# Altium footprint library TarabusLibrary.PcbLib: 591 footprints (part 18 of 37)
Each footprint in its own frame and in the unit in brackets; x right, y up, seen from the top. Pads: shape width x height; smd on the part's side, far side on the other; paste and mask are expansions set on the pad; w line width, h text height; cw(c..) or ccw(c..) is an arc to the next point about the centre after c.
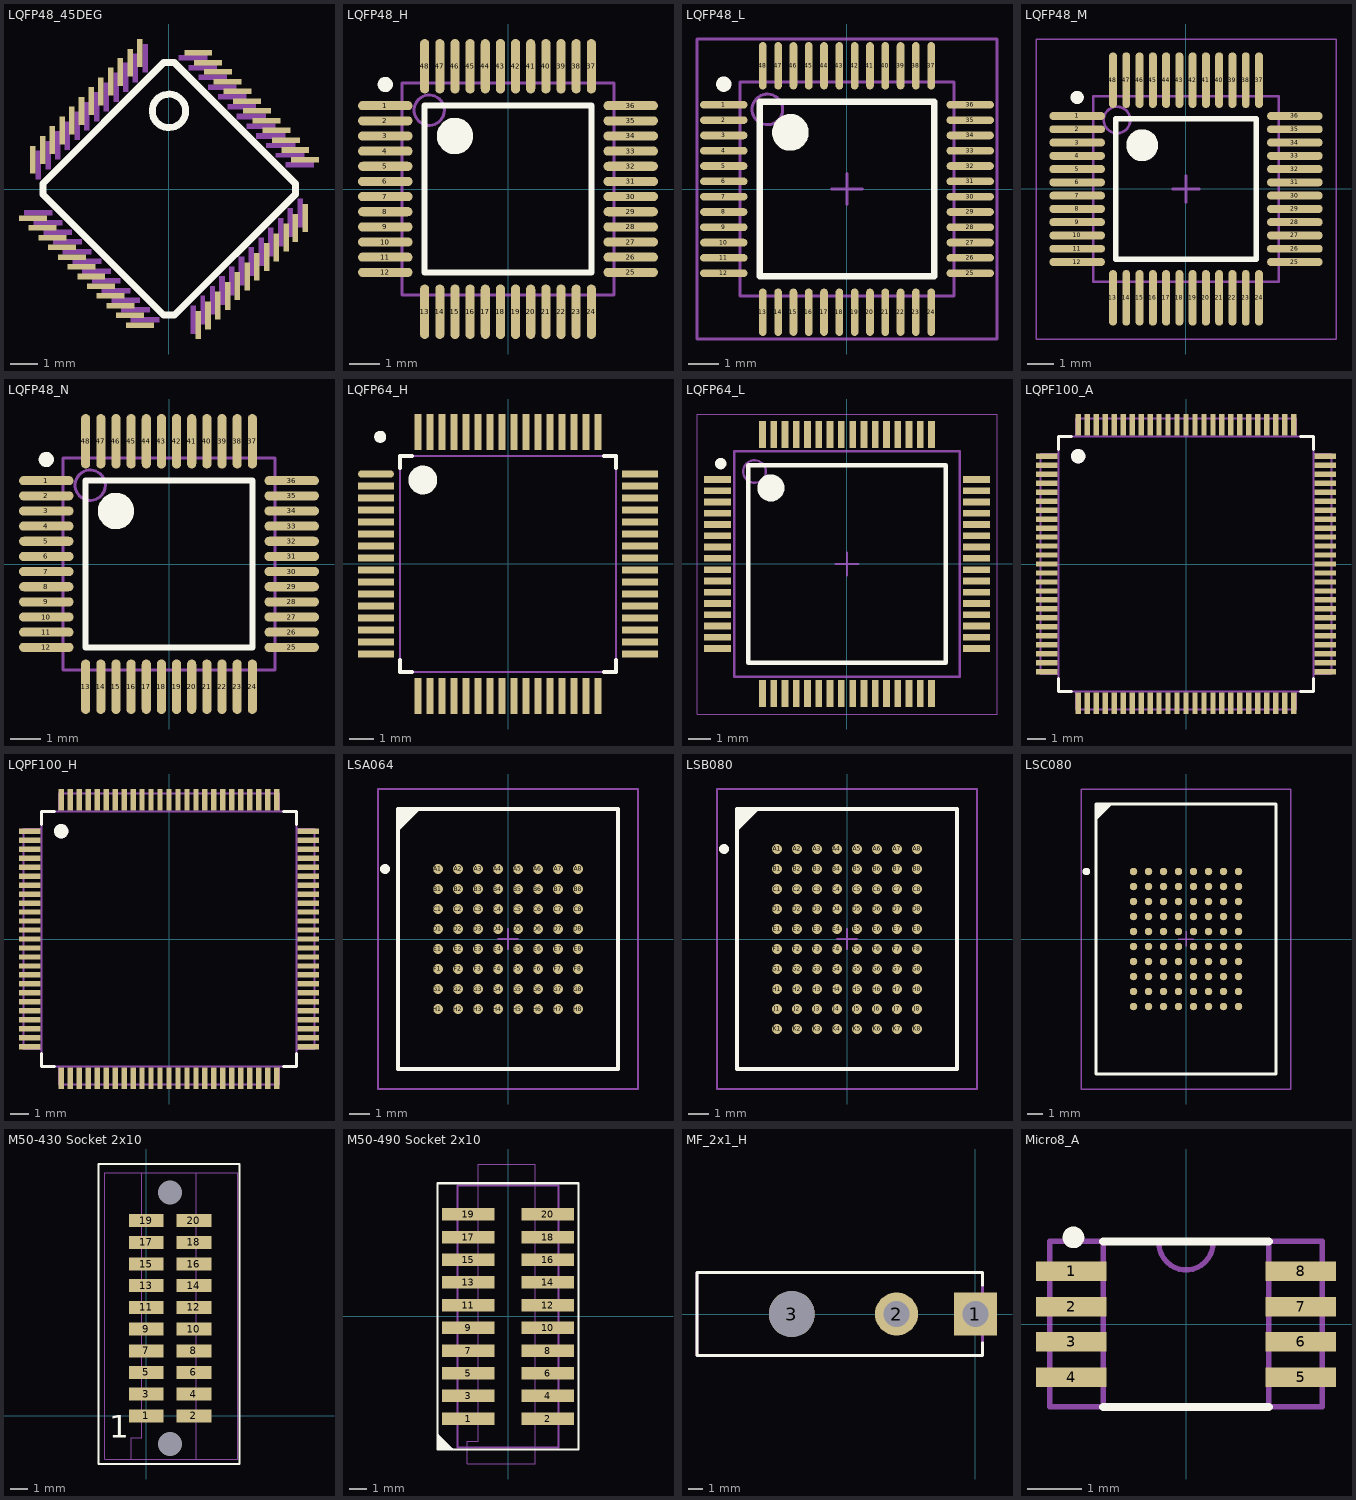
[diagram p17: the footprints below, top view; thin cyan lines are the x and y axes]

## LQFP48_45DEG [mil]
pads (48):
  rect 8x40 smd: 1(-41.76,195) 2(-55.68,181) 3(-69.59,168) 4(-83.52,154) 5(-97.43,140) 6(-111.35,126) 7(-125.27,112) 8(-139.19,98) 9(-153.11,84) 10(-167.03,70) 11(-180.95,56) 12(-194.87,42) 25(42,-194.87) 26(56,-180.95) 27(70,-167.03) 28(84,-153.11) 29(98,-139.19) 30(112,-125.27) 31(126,-111.35) 32(140,-97.43) 33(154,-83.52) 34(168,-69.59) 35(181,-55.68) 36(195,-41.76)
  rect 40x8 smd: 13(-194.87,-41.76) 14(-180.95,-55.68) 15(-167.03,-69.59) 16(-153.11,-83.52) 17(-139.19,-97.43) 18(-125.27,-111.35) 19(-111.35,-125.27) 20(-97.43,-139.19) 21(-83.52,-153.11) 22(-69.59,-167.03) 23(-55.68,-180.95) 24(-41.76,-194.87) 37(195,42) 38(181,56) 39(168,70) 40(154,84) 41(140,98) 42(126,112) 43(112,126) 44(98,140) 45(84,154) 46(70,168) 47(56,181) 48(42,195)
Top Overlay:
  circle w10: c0,112 r24
  lines w10: -180.26,-7.65 -180.26,8 -7.65,181 8,181 181,8 181,-7.65 8,-180.26 -7.65,-180.26 -180.26,-7.65
Mechanical 16:
  rectangle: 14,184 55,192
  rectangle: 28,170 69,178
  rectangle: 42,156 83,164
  rectangle: 56,142 97,150
  rectangle: 70,128 111,136
  rectangle: 84,114 125,122
  rectangle: 97,100 139,108
  rectangle: 111,86 153,94
  rectangle: 125,72 167,80
  rectangle: 139,59 181,66
  rectangle: 153,45 194,52
  rectangle: 167,31 208,39
  rectangle: 184,-54.77 192,-13.43
  rectangle: 170,-68.69 178,-27.35
  rectangle: 156,-82.61 164,-41.27
  rectangle: 142,-96.53 150,-55.19
  rectangle: 128,-110.45 136,-69.11
  rectangle: 114,-124.37 122,-83.03
  rectangle: 100,-138.29 108,-96.95
  rectangle: 86,-152.2 94,-110.87
  rectangle: 72,-166.13 80,-124.79
  rectangle: 59,-180.04 66,-138.7
  rectangle: 45,-193.96 52,-152.63
  rectangle: 31,-207.88 39,-166.54
  rectangle: -54.77,-191.15 -13.43,-183.28
  rectangle: -68.69,-177.23 -27.35,-169.36
  rectangle: -82.61,-163.31 -41.27,-155.44
  rectangle: -96.53,-149.39 -55.19,-141.52
  rectangle: -110.45,-135.47 -69.11,-127.6
  rectangle: -124.37,-121.56 -83.03,-113.68
  rectangle: -138.29,-107.63 -96.95,-99.76
  rectangle: -152.2,-93.72 -110.87,-85.84
  rectangle: -166.13,-79.8 -124.79,-71.92
  rectangle: -180.04,-65.88 -138.7,-58
  rectangle: -193.96,-51.96 -152.63,-44.08
  rectangle: -207.88,-38.04 -166.54,-30.17
  rectangle: -191.15,14 -183.28,55
  rectangle: -177.23,28 -169.36,69
  rectangle: -163.31,42 -155.44,83
  rectangle: -149.39,56 -141.52,97
  rectangle: -135.47,70 -127.6,111
  rectangle: -121.56,84 -113.68,125
  rectangle: -107.63,97 -99.76,139
  rectangle: -93.72,111 -85.84,153
  rectangle: -79.8,125 -71.92,167
  rectangle: -65.88,139 -58,181
  rectangle: -51.96,153 -44.08,194
  rectangle: -38.04,167 -30.17,208

## LQFP48_H [mm]
height 1.6
pads (48):
  oval 1.8x0.3 smd: 1(-4.05,2.75) 2(-4.05,2.25) 3(-4.05,1.75) 4(-4.05,1.25) 5(-4.05,0.75) 6(-4.05,0.25) 7(-4.05,-0.25) 8(-4.05,-0.75) 9(-4.05,-1.25) 10(-4.05,-1.75) 11(-4.05,-2.25) 12(-4.05,-2.75) 25(4.05,-2.75) 26(4.05,-2.25) 27(4.05,-1.75) 28(4.05,-1.25) 29(4.05,-0.75) 30(4.05,-0.25) 31(4.05,0.25) 32(4.05,0.75) 33(4.05,1.25) 34(4.05,1.75) 35(4.05,2.25) 36(4.05,2.75)
  oval 0.3x1.8 smd: 13(-2.75,-4.05) 14(-2.25,-4.05) 15(-1.75,-4.05) 16(-1.25,-4.05) 17(-0.75,-4.05) 18(-0.25,-4.05) 19(0.25,-4.05) 20(0.75,-4.05) 21(1.25,-4.05) 22(1.75,-4.05) 23(2.25,-4.05) 24(2.75,-4.05) 37(2.75,4.05) 38(2.25,4.05) 39(1.75,4.05) 40(1.25,4.05) 41(0.75,4.05) 42(0.25,4.05) 43(-0.25,4.05) 44(-0.75,4.05) 45(-1.25,4.05) 46(-1.75,4.05) 47(-2.25,4.05) 48(-2.75,4.05)
Top Overlay:
  circle w0.6: c-1.75,1.75 r0.3
  circle w0.25: c-4.05,3.45 r0.125
  lines w0.2: -2.75,-2.75 2.75,-2.75 2.75,2.75 -2.75,2.75 -2.75,-2.75
Mechanical 7:
  circle w0.1: c-2.6,2.6 r0.5
  lines w0.1: -3.5,-3.5 3.5,-3.5 3.5,3.5 -3.5,3.5 -3.5,-3.5
Mechanical 10:
  text ".Designator" at 1.9,5.4 h0.8
  text ".Comment" at -3.7,-5.6 h0.6
3D body "vbh48a.stp": height 1.46, standoff -0.04, extent -4.507,-4.507 4.508,4.508

## LQFP48_L [mm] "Thin QFP, 48-Leads, Body 7x7mm, Pitch 0.5mm, IPC High Density"
height 1.6
pads (48):
  oval 1.55x0.25 smd: 1(-4.025,2.75) 2(-4.025,2.25) 3(-4.025,1.75) 4(-4.025,1.25) 5(-4.025,0.75) 6(-4.025,0.25) 7(-4.025,-0.25) 8(-4.025,-0.75) 9(-4.025,-1.25) 10(-4.025,-1.75) 11(-4.025,-2.25) 12(-4.025,-2.75) 25(4.025,-2.75) 26(4.025,-2.25) 27(4.025,-1.75) 28(4.025,-1.25) 29(4.025,-0.75) 30(4.025,-0.25) 31(4.025,0.25) 32(4.025,0.75) 33(4.025,1.25) 34(4.025,1.75) 35(4.025,2.25) 36(4.025,2.75)
  oval 0.25x1.55 smd: 13(-2.75,-4.025) 14(-2.25,-4.025) 15(-1.75,-4.025) 16(-1.25,-4.025) 17(-0.75,-4.025) 18(-0.25,-4.025) 19(0.25,-4.025) 20(0.75,-4.025) 21(1.25,-4.025) 22(1.75,-4.025) 23(2.25,-4.025) 24(2.75,-4.025) 37(2.75,4.025) 38(2.25,4.025) 39(1.75,4.025) 40(1.25,4.025) 41(0.75,4.025) 42(0.25,4.025) 43(-0.25,4.025) 44(-0.75,4.025) 45(-1.25,4.025) 46(-1.75,4.025) 47(-2.25,4.025) 48(-2.75,4.025)
Top Overlay:
  circle w0.25: c-4.025,3.425 r0.125
  circle w0.6: c-1.85,1.85 r0.3
  lines w0.2: -2.85,-2.85 -2.85,2.85 2.85,2.85 2.85,-2.85 -2.85,-2.85
Mechanical 13:
  circle w0.1: c-2.6,2.6 r0.5
  lines w0.1: -3.5,-3.5 -3.5,3.5 3.5,3.5 3.5,-3.5 -3.5,-3.5
Mechanical 15:
  lines w0.1: -0.5,0 0.5,0 ; 0,-0.5 0,0.5 ; -4.9,-4.9 -4.9,4.9 4.9,4.9 4.9,-4.9 -4.9,-4.9
3D body: height 1.6, standoff 0, extent -3.5,-3.5 3.5,3.5

## LQFP48_M [mm] "QFP, 48-Leads, Body 7x7mm, Pitch 0.5mm, IPC Low Density"
height 1.6
pads (48):
  oval 2.1x0.3 smd: 1(-4.1,2.75) 2(-4.1,2.25) 3(-4.1,1.75) 4(-4.1,1.25) 5(-4.1,0.75) 6(-4.1,0.25) 7(-4.1,-0.25) 8(-4.1,-0.75) 9(-4.1,-1.25) 10(-4.1,-1.75) 11(-4.1,-2.25) 12(-4.1,-2.75) 25(4.1,-2.75) 26(4.1,-2.25) 27(4.1,-1.75) 28(4.1,-1.25) 29(4.1,-0.75) 30(4.1,-0.25) 31(4.1,0.25) 32(4.1,0.75) 33(4.1,1.25) 34(4.1,1.75) 35(4.1,2.25) 36(4.1,2.75)
  oval 0.3x2.1 smd: 13(-2.75,-4.1) 14(-2.25,-4.1) 15(-1.75,-4.1) 16(-1.25,-4.1) 17(-0.75,-4.1) 18(-0.25,-4.1) 19(0.25,-4.1) 20(0.75,-4.1) 21(1.25,-4.1) 22(1.75,-4.1) 23(2.25,-4.1) 24(2.75,-4.1) 37(2.75,4.1) 38(2.25,4.1) 39(1.75,4.1) 40(1.25,4.1) 41(0.75,4.1) 42(0.25,4.1) 43(-0.25,4.1) 44(-0.75,4.1) 45(-1.25,4.1) 46(-1.75,4.1) 47(-2.25,4.1) 48(-2.75,4.1)
Top Overlay:
  circle w0.6: c-1.65,1.65 r0.3
  circle w0.25: c-4.1,3.45 r0.125
  lines w0.2: -2.65,-2.65 2.65,-2.65 2.65,2.65 -2.65,2.65 -2.65,-2.65
Mechanical 13:
  circle w0.1: c-2.6,2.6 r0.5
  lines w0.1: -3.5,-3.5 3.5,-3.5 3.5,3.5 -3.5,3.5 -3.5,-3.5
Mechanical 15:
  lines w0.05: -5.65,-5.65 5.65,-5.65 5.65,5.65 -5.65,5.65 -5.65,-5.65
  lines w0.1: -0.5,0 0.5,0 ; 0,-0.5 0,0.5
3D body: height 1.6, standoff 0.05, extent -3.5,-3.5 3.5,3.5

## LQFP48_N [mm] "Thin QFP, 48-Leads, Body 7x7mm, Pitch 0.5mm, IPC Medium Density"
height 1.6
pads (48):
  oval 1.8x0.3 smd: 1(-4.05,2.75) 2(-4.05,2.25) 3(-4.05,1.75) 4(-4.05,1.25) 5(-4.05,0.75) 6(-4.05,0.25) 7(-4.05,-0.25) 8(-4.05,-0.75) 9(-4.05,-1.25) 10(-4.05,-1.75) 11(-4.05,-2.25) 12(-4.05,-2.75) 25(4.05,-2.75) 26(4.05,-2.25) 27(4.05,-1.75) 28(4.05,-1.25) 29(4.05,-0.75) 30(4.05,-0.25) 31(4.05,0.25) 32(4.05,0.75) 33(4.05,1.25) 34(4.05,1.75) 35(4.05,2.25) 36(4.05,2.75)
  oval 0.3x1.8 smd: 13(-2.75,-4.05) 14(-2.25,-4.05) 15(-1.75,-4.05) 16(-1.25,-4.05) 17(-0.75,-4.05) 18(-0.25,-4.05) 19(0.25,-4.05) 20(0.75,-4.05) 21(1.25,-4.05) 22(1.75,-4.05) 23(2.25,-4.05) 24(2.75,-4.05) 37(2.75,4.05) 38(2.25,4.05) 39(1.75,4.05) 40(1.25,4.05) 41(0.75,4.05) 42(0.25,4.05) 43(-0.25,4.05) 44(-0.75,4.05) 45(-1.25,4.05) 46(-1.75,4.05) 47(-2.25,4.05) 48(-2.75,4.05)
Top Overlay:
  circle w0.25: c-4.05,3.45 r0.125
  circle w0.6: c-1.75,1.75 r0.3
  lines w0.2: -2.75,-2.75 -2.75,2.75 2.75,2.75 2.75,-2.75 -2.75,-2.75
Mechanical 7:
  circle w0.1: c-2.6,2.6 r0.5
  lines w0.1: -3.5,-3.5 -3.5,3.5 3.5,3.5 3.5,-3.5 -3.5,-3.5
Mechanical 10:
  text ".Comment" at -3.7,-5.6 h0.6
  text ".Designator" at 1.9,5.4 h0.8
3D body "vbh48a.stp": height 1.46, standoff -0.04, extent -4.507,-4.507 4.508,4.508

## LQFP64_H [mm] "64-Pin Low Profile Quad Pack 0.5 mm Pitch, IPC High Density"
height 1.6
pads (64):
  oval 1.5x0.3 smd mask+0.05: 1(-5.5,3.75)
  rect 1.5x0.3 smd mask+0.05: 2(-5.5,3.25) 3(-5.5,2.75) 4(-5.5,2.25) 5(-5.5,1.75) 6(-5.5,1.25) 7(-5.5,0.75) 8(-5.5,0.25) 9(-5.5,-0.25) 10(-5.5,-0.75) 11(-5.5,-1.25) 12(-5.5,-1.75) 13(-5.5,-2.25) 14(-5.5,-2.75) 15(-5.5,-3.25) 16(-5.5,-3.75) 33(5.5,-3.75) 34(5.5,-3.25) 35(5.5,-2.75) 36(5.5,-2.25) 37(5.5,-1.75) 38(5.5,-1.25) 39(5.5,-0.75) 40(5.5,-0.25) 41(5.5,0.25) 42(5.5,0.75) 43(5.5,1.25) 44(5.5,1.75) 45(5.5,2.25) 46(5.5,2.75) 47(5.5,3.25) 48(5.5,3.75)
  rect 0.3x1.5 smd mask+0.05: 17(-3.75,-5.5) 18(-3.25,-5.5) 19(-2.75,-5.5) 20(-2.25,-5.5) 21(-1.75,-5.5) 22(-1.25,-5.5) 23(-0.75,-5.5) 24(-0.25,-5.5) 25(0.25,-5.5) 26(0.75,-5.5) 27(1.25,-5.5) 28(1.75,-5.5) 29(2.25,-5.5) 30(2.75,-5.5) 31(3.25,-5.5) 32(3.75,-5.5) 49(3.75,5.5) 50(3.25,5.5) 51(2.75,5.5) 52(2.25,5.5) 53(1.75,5.5) 54(1.25,5.5) 55(0.75,5.5) 56(0.25,5.5) 57(-0.25,5.5) 58(-0.75,5.5) 59(-1.25,5.5) 60(-1.75,5.5) 61(-2.25,5.5) 62(-2.75,5.5) 63(-3.25,5.5) 64(-3.75,5.5)
Top Overlay:
  circle w0.6: c-3.55,3.5 r0.3
  circle w0.25: c-5.325,5.3 r0.125
  lines w0.15: -4.5,-4 -4.5,-4.5 -4,-4.5 ; -4.5,4 -4.5,4.5 -4,4.5 ; 4,-4.5 4.5,-4.5 4.5,-4 ; 4,4.5 4.5,4.5 4.5,4
Mechanical 7:
  lines w0.1: -4.5,-4.5 4.5,-4.5 4.5,4.5 -4.5,4.5 -4.5,-4.5
3D body "User Library-lqpf64.step": height 1.5, standoff 0.02, extent -6,-6 6,6

## LQFP64_L [mm] "TSQFP, 64-Leads, Body 10,00x10,00mm, Pitch 0,50mm, IPC Medium Density"
height 1.6
pads (64):
  rect 1.2x0.3 smd: 1(-5.75,3.75) 2(-5.75,3.25) 3(-5.75,2.75) 4(-5.75,2.25) 5(-5.75,1.75) 6(-5.75,1.25) 7(-5.75,0.75) 8(-5.75,0.25) 9(-5.75,-0.25) 10(-5.75,-0.75) 11(-5.75,-1.25) 12(-5.75,-1.75) 13(-5.75,-2.25) 14(-5.75,-2.75) 15(-5.75,-3.25) 16(-5.75,-3.75) 33(5.75,-3.75) 34(5.75,-3.25) 35(5.75,-2.75) 36(5.75,-2.25) 37(5.75,-1.75) 38(5.75,-1.25) 39(5.75,-0.75) 40(5.75,-0.25) 41(5.75,0.25) 42(5.75,0.75) 43(5.75,1.25) 44(5.75,1.75) 45(5.75,2.25) 46(5.75,2.75) 47(5.75,3.25) 48(5.75,3.75)
  rect 0.3x1.2 smd: 17(-3.75,-5.75) 18(-3.25,-5.75) 19(-2.75,-5.75) 20(-2.25,-5.75) 21(-1.75,-5.75) 22(-1.25,-5.75) 23(-0.75,-5.75) 24(-0.25,-5.75) 25(0.25,-5.75) 26(0.75,-5.75) 27(1.25,-5.75) 28(1.75,-5.75) 29(2.25,-5.75) 30(2.75,-5.75) 31(3.25,-5.75) 32(3.75,-5.75) 49(3.75,5.75) 50(3.25,5.75) 51(2.75,5.75) 52(2.25,5.75) 53(1.75,5.75) 54(1.25,5.75) 55(0.75,5.75) 56(0.25,5.75) 57(-0.25,5.75) 58(-0.75,5.75) 59(-1.25,5.75) 60(-1.75,5.75) 61(-2.25,5.75) 62(-2.75,5.75) 63(-3.25,5.75) 64(-3.75,5.75)
Top Overlay:
  circle w0.6: c-3.375,3.375 r0.3
  circle w0.25: c-5.6,4.45 r0.125
  lines w0.2: -4.375,-4.375 4.375,-4.375 4.375,4.375 -4.375,4.375 -4.375,-4.375
Mechanical 7:
  circle w0.1: c-4.1,4.1 r0.5
  lines w0.1: -5,-5 5,-5 5,5 -5,5 -5,-5
Mechanical 15:
  lines w0.05: -6.65,-6.65 6.65,-6.65 6.65,6.65 -6.65,6.65 -6.65,-6.65
  lines w0.1: -0.5,0 0.5,0 ; 0,-0.5 0,0.5
3D body "LQFP64-0_5.STEP": height 1.55, standoff -0.02, extent -5.886,-5.886 5.886,5.886

## LQPF100_A [mm]
height 1.6
pads (100):
  rect 1.2x0.3 smd: 1(-7.75,6) 2(-7.75,5.5) 3(-7.75,5) 4(-7.75,4.5) 5(-7.75,4) 6(-7.75,3.5) 7(-7.75,3) 8(-7.75,2.5) 9(-7.75,2) 10(-7.75,1.5) 11(-7.75,1) 12(-7.75,0.5) 13(-7.75,0) 14(-7.75,-0.5) 15(-7.75,-1) 16(-7.75,-1.5) 17(-7.75,-2) 18(-7.75,-2.5) 19(-7.75,-3) 20(-7.75,-3.5) 21(-7.75,-4) 22(-7.75,-4.5) 23(-7.75,-5) 24(-7.75,-5.5) 25(-7.75,-6) 51(7.75,-6) 52(7.75,-5.5) 53(7.75,-5) 54(7.75,-4.5) 55(7.75,-4) 56(7.75,-3.5) 57(7.75,-3) 58(7.75,-2.5) 59(7.75,-2) 60(7.75,-1.5) 61(7.75,-1) 62(7.75,-0.5) 63(7.75,0) 64(7.75,0.5) 65(7.75,1) 66(7.75,1.5) 67(7.75,2) 68(7.75,2.5) 69(7.75,3) 70(7.75,3.5) 71(7.75,4) 72(7.75,4.5) 73(7.75,5) 74(7.75,5.5) 75(7.75,6)
  rect 0.3x1.2 smd: 26(-6,-7.75) 27(-5.5,-7.75) 28(-5,-7.75) 29(-4.5,-7.75) 30(-4,-7.75) 31(-3.5,-7.75) 32(-3,-7.75) 33(-2.5,-7.75) 34(-2,-7.75) 35(-1.5,-7.75) 36(-1,-7.75) 37(-0.5,-7.75) 38(0,-7.75) 39(0.5,-7.75) 40(1,-7.75) 41(1.5,-7.75) 42(2,-7.75) 43(2.5,-7.75) 44(3,-7.75) 45(3.5,-7.75) 46(4,-7.75) 47(4.5,-7.75) 48(5,-7.75) 49(5.5,-7.75) 50(6,-7.75) 76(6,7.75) 77(5.5,7.75) 78(5,7.75) 79(4.5,7.75) 80(4,7.75) 81(3.5,7.75) 82(3,7.75) 83(2.5,7.75) 84(2,7.75) 85(1.5,7.75) 86(1,7.75) 87(0.5,7.75) 88(0,7.75) 89(-0.5,7.75) 90(-1,7.75) 91(-1.5,7.75) 92(-2,7.75) 93(-2.5,7.75) 94(-3,7.75) 95(-3.5,7.75) 96(-4,7.75) 97(-4.5,7.75) 98(-5,7.75) 99(-5.5,7.75) 100(-6,7.75)
Top Overlay:
  circle w0.4: c-6,6 r0.2
  lines w0.15: -7.1,-6.375 -7.1,-7.1 -6.375,-7.1 ; -7.1,6.375 -7.1,7.1 -6.375,7.1 ; 6.375,-7.1 7.1,-7.1 7.1,-6.375 ; 6.375,7.1 7.1,7.1 7.1,6.375
Mechanical 7:
  circle w0.4: c-6,6 r0.2
  lines w0.1: -7.1,-6.135 -8.1,-6.135 -8.1,6.135 -7.1,6.135 ; -6.135,-7.1 -6.135,-8.1 6.135,-8.1 6.135,-7.1 ; -6.135,7.1 -6.135,8.1 6.135,8.1 6.135,7.1 ; 7.1,-6.135 8.1,-6.135 8.1,6.135 7.1,6.135 ; -7.1,-7.1 -7.1,7.1 7.1,7.1 7.1,-7.1 -7.1,-7.1
Mechanical 10:
  text ".Comment" at -1.08,-0.495 h0.6
  text ".Designator" at -1.2,0.155 h0.8
3D body: height 1.6, standoff 0, extent -7.1,-7.1 7.1,7.1
3D body: height 0.9, standoff 0, extent -6.135,7.1 6.135,8.1
3D body: height 0.9, standoff 0, extent -8.1,-6.135 -7.1,6.135
3D body: height 0.9, standoff 0, extent 7.1,-6.135 8.1,6.135
3D body: height 0.9, standoff 0, extent -6.135,-8.1 6.135,-7.1

## LQPF100_H [mm]
height 1.6
pads (100):
  rect 1.2x0.3 smd: 1(-7.75,6) 2(-7.75,5.5) 3(-7.75,5) 4(-7.75,4.5) 5(-7.75,4) 6(-7.75,3.5) 7(-7.75,3) 8(-7.75,2.5) 9(-7.75,2) 10(-7.75,1.5) 11(-7.75,1) 12(-7.75,0.5) 13(-7.75,0) 14(-7.75,-0.5) 15(-7.75,-1) 16(-7.75,-1.5) 17(-7.75,-2) 18(-7.75,-2.5) 19(-7.75,-3) 20(-7.75,-3.5) 21(-7.75,-4) 22(-7.75,-4.5) 23(-7.75,-5) 24(-7.75,-5.5) 25(-7.75,-6) 51(7.75,-6) 52(7.75,-5.5) 53(7.75,-5) 54(7.75,-4.5) 55(7.75,-4) 56(7.75,-3.5) 57(7.75,-3) 58(7.75,-2.5) 59(7.75,-2) 60(7.75,-1.5) 61(7.75,-1) 62(7.75,-0.5) 63(7.75,0) 64(7.75,0.5) 65(7.75,1) 66(7.75,1.5) 67(7.75,2) 68(7.75,2.5) 69(7.75,3) 70(7.75,3.5) 71(7.75,4) 72(7.75,4.5) 73(7.75,5) 74(7.75,5.5) 75(7.75,6)
  rect 0.3x1.2 smd: 26(-6,-7.75) 27(-5.5,-7.75) 28(-5,-7.75) 29(-4.5,-7.75) 30(-4,-7.75) 31(-3.5,-7.75) 32(-3,-7.75) 33(-2.5,-7.75) 34(-2,-7.75) 35(-1.5,-7.75) 36(-1,-7.75) 37(-0.5,-7.75) 38(0,-7.75) 39(0.5,-7.75) 40(1,-7.75) 41(1.5,-7.75) 42(2,-7.75) 43(2.5,-7.75) 44(3,-7.75) 45(3.5,-7.75) 46(4,-7.75) 47(4.5,-7.75) 48(5,-7.75) 49(5.5,-7.75) 50(6,-7.75) 76(6,7.75) 77(5.5,7.75) 78(5,7.75) 79(4.5,7.75) 80(4,7.75) 81(3.5,7.75) 82(3,7.75) 83(2.5,7.75) 84(2,7.75) 85(1.5,7.75) 86(1,7.75) 87(0.5,7.75) 88(0,7.75) 89(-0.5,7.75) 90(-1,7.75) 91(-1.5,7.75) 92(-2,7.75) 93(-2.5,7.75) 94(-3,7.75) 95(-3.5,7.75) 96(-4,7.75) 97(-4.5,7.75) 98(-5,7.75) 99(-5.5,7.75) 100(-6,7.75)
Top Overlay:
  circle w0.4: c-6,6 r0.2
  lines w0.15: -7.1,-6.375 -7.1,-7.1 -6.375,-7.1 ; -7.1,6.375 -7.1,7.1 -6.375,7.1 ; 6.375,-7.1 7.1,-7.1 7.1,-6.375 ; 6.375,7.1 7.1,7.1 7.1,6.375
Mechanical 7:
  circle w0.4: c-6,6 r0.2
  lines w0.1: -7.1,-6.135 -8.1,-6.135 -8.1,6.135 -7.1,6.135 ; -6.135,-7.1 -6.135,-8.1 6.135,-8.1 6.135,-7.1 ; -6.135,7.1 -6.135,8.1 6.135,8.1 6.135,7.1 ; 7.1,-6.135 8.1,-6.135 8.1,6.135 7.1,6.135 ; -7.1,-7.1 -7.1,7.1 7.1,7.1 7.1,-7.1 -7.1,-7.1
Mechanical 10:
  text ".Comment" at -1.08,-0.495 h0.6
  text ".Designator" at -1.2,0.155 h0.8
3D body "User Library-LQFP100-3.STEP": height 1.62, standoff -0.01, extent -8.072,-8.072 8.072,8.072

## LSA064 [mm] "64-Ball Fortified Ball Grid Array Rectangular 1 mm Pitch"
height 1.7
pads (64):
  round 0.5 smd: A1(-3.5,3.5) A2(-2.5,3.5) A3(-1.5,3.5) A4(-0.5,3.5) A5(0.5,3.5) A6(1.5,3.5) A7(2.5,3.5) A8(3.5,3.5) B1(-3.5,2.5) B2(-2.5,2.5) B3(-1.5,2.5) B4(-0.5,2.5) B5(0.5,2.5) B6(1.5,2.5) B7(2.5,2.5) B8(3.5,2.5) C1(-3.5,1.5) C2(-2.5,1.5) C3(-1.5,1.5) C4(-0.5,1.5) C5(0.5,1.5) C6(1.5,1.5) C7(2.5,1.5) C8(3.5,1.5) D1(-3.5,0.5) D2(-2.5,0.5) D3(-1.5,0.5) D4(-0.5,0.5) D5(0.5,0.5) D6(1.5,0.5) D7(2.5,0.5) D8(3.5,0.5) E1(-3.5,-0.5) E2(-2.5,-0.5) E3(-1.5,-0.5) E4(-0.5,-0.5) E5(0.5,-0.5) E6(1.5,-0.5) E7(2.5,-0.5) E8(3.5,-0.5) F1(-3.5,-1.5) F2(-2.5,-1.5) F3(-1.5,-1.5) F4(-0.5,-1.5) F5(0.5,-1.5) F6(1.5,-1.5) F7(2.5,-1.5) F8(3.5,-1.5) G1(-3.5,-2.5) G2(-2.5,-2.5) G3(-1.5,-2.5) G4(-0.5,-2.5) G5(0.5,-2.5) G6(1.5,-2.5) G7(2.5,-2.5) G8(3.5,-2.5) H1(-3.5,-3.5) H2(-2.5,-3.5) H3(-1.5,-3.5) H4(-0.5,-3.5) H5(0.5,-3.5) H6(1.5,-3.5) H7(2.5,-3.5) H8(3.5,-3.5)
Top Overlay:
  circle w0.25: c-6.15,3.5 r0.125
  region: -4.5,6.5 -5.5,5.5 -5.5,6.5
  lines w0.2: -5.5,5.5 -4.5,6.5 ; -5.5,-6.5 -5.5,6.5 5.5,6.5 5.5,-6.5 -5.5,-6.5
Mechanical 13:
  lines w0.1: -5.5,-6.5 -5.5,6.5 5.5,6.5 5.5,-6.5 -5.5,-6.5
Mechanical 15:
  lines w0.1: -0.5,0 0.5,0 ; 0,-0.5 0,0.5 ; -6.5,-7.5 -6.5,7.5 6.5,7.5 6.5,-7.5 -6.5,-7.5
3D body: height 1.7, standoff 0, extent -5.5,-6.5 5.5,6.5

## LSB080 [mm] "80-Ball Fortified Ball Grid Array Rectangular 1 mm Pitch"
height 1.6
pads (80):
  round 0.5 smd: A1(-3.5,4.5) A2(-2.5,4.5) A3(-1.5,4.5) A4(-0.5,4.5) A5(0.5,4.5) A6(1.5,4.5) A7(2.5,4.5) A8(3.5,4.5) B1(-3.5,3.5) B2(-2.5,3.5) B3(-1.5,3.5) B4(-0.5,3.5) B5(0.5,3.5) B6(1.5,3.5) B7(2.5,3.5) B8(3.5,3.5) C1(-3.5,2.5) C2(-2.5,2.5) C3(-1.5,2.5) C4(-0.5,2.5) C5(0.5,2.5) C6(1.5,2.5) C7(2.5,2.5) C8(3.5,2.5) D1(-3.5,1.5) D2(-2.5,1.5) D3(-1.5,1.5) D4(-0.5,1.5) D5(0.5,1.5) D6(1.5,1.5) D7(2.5,1.5) D8(3.5,1.5) E1(-3.5,0.5) E2(-2.5,0.5) E3(-1.5,0.5) E4(-0.5,0.5) E5(0.5,0.5) E6(1.5,0.5) E7(2.5,0.5) E8(3.5,0.5) F1(-3.5,-0.5) F2(-2.5,-0.5) F3(-1.5,-0.5) F4(-0.5,-0.5) F5(0.5,-0.5) F6(1.5,-0.5) F7(2.5,-0.5) F8(3.5,-0.5) G1(-3.5,-1.5) G2(-2.5,-1.5) G3(-1.5,-1.5) G4(-0.5,-1.5) G5(0.5,-1.5) G6(1.5,-1.5) G7(2.5,-1.5) G8(3.5,-1.5) H1(-3.5,-2.5) H2(-2.5,-2.5) H3(-1.5,-2.5) H4(-0.5,-2.5) H5(0.5,-2.5) H6(1.5,-2.5) H7(2.5,-2.5) H8(3.5,-2.5) J1(-3.5,-3.5) J2(-2.5,-3.5) J3(-1.5,-3.5) J4(-0.5,-3.5) J5(0.5,-3.5) J6(1.5,-3.5) J7(2.5,-3.5) J8(3.5,-3.5) K1(-3.5,-4.5) K2(-2.5,-4.5) K3(-1.5,-4.5) K4(-0.5,-4.5) K5(0.5,-4.5) K6(1.5,-4.5) K7(2.5,-4.5) K8(3.5,-4.5)
Top Overlay:
  circle w0.25: c-6.15,4.5 r0.125
  region: -4.5,6.5 -5.5,5.5 -5.5,6.5
  lines w0.2: -5.5,5.5 -4.5,6.5 ; -5.5,-6.5 5.5,-6.5 5.5,6.5 -5.5,6.5 -5.5,-6.5
Mechanical 13:
  lines w0.1: -5.5,-6.5 5.5,-6.5 5.5,6.5 -5.5,6.5 -5.5,-6.5
Mechanical 15:
  lines w0.1: -0.5,0 0.5,0 ; 0,-0.5 0,0.5 ; -6.5,-7.5 6.5,-7.5 6.5,7.5 -6.5,7.5 -6.5,-7.5
3D body: height 1.6, standoff 0, extent -5.5,-6.5 5.5,6.5

## LSC080 [mm] "80-Ball Fortified Ball Grid Array Rectangular 1 mm Pitch"
height 1.6
pads (80):
  round 0.5 smd: A1(-3.5,4.5) A2(-2.5,4.5) A3(-1.5,4.5) A4(-0.5,4.5) A5(0.5,4.5) A6(1.5,4.5) A7(2.5,4.5) A8(3.5,4.5) B1(-3.5,3.5) B2(-2.5,3.5) B3(-1.5,3.5) B4(-0.5,3.5) B5(0.5,3.5) B6(1.5,3.5) B7(2.5,3.5) B8(3.5,3.5) C1(-3.5,2.5) C2(-2.5,2.5) C3(-1.5,2.5) C4(-0.5,2.5) C5(0.5,2.5) C6(1.5,2.5) C7(2.5,2.5) C8(3.5,2.5) D1(-3.5,1.5) D2(-2.5,1.5) D3(-1.5,1.5) D4(-0.5,1.5) D5(0.5,1.5) D6(1.5,1.5) D7(2.5,1.5) D8(3.5,1.5) E1(-3.5,0.5) E2(-2.5,0.5) E3(-1.5,0.5) E4(-0.5,0.5) E5(0.5,0.5) E6(1.5,0.5) E7(2.5,0.5) E8(3.5,0.5) F1(-3.5,-0.5) F2(-2.5,-0.5) F3(-1.5,-0.5) F4(-0.5,-0.5) F5(0.5,-0.5) F6(1.5,-0.5) F7(2.5,-0.5) F8(3.5,-0.5) G1(-3.5,-1.5) G2(-2.5,-1.5) G3(-1.5,-1.5) G4(-0.5,-1.5) G5(0.5,-1.5) G6(1.5,-1.5) G7(2.5,-1.5) G8(3.5,-1.5) H1(-3.5,-2.5) H2(-2.5,-2.5) H3(-1.5,-2.5) H4(-0.5,-2.5) H5(0.5,-2.5) H6(1.5,-2.5) H7(2.5,-2.5) H8(3.5,-2.5) J1(-3.5,-3.5) J2(-2.5,-3.5) J3(-1.5,-3.5) J4(-0.5,-3.5) J5(0.5,-3.5) J6(1.5,-3.5) J7(2.5,-3.5) J8(3.5,-3.5) K1(-3.5,-4.5) K2(-2.5,-4.5) K3(-1.5,-4.5) K4(-0.5,-4.5) K5(0.5,-4.5) K6(1.5,-4.5) K7(2.5,-4.5) K8(3.5,-4.5)
Top Overlay:
  circle w0.25: c-6.65,4.5 r0.125
  region: -5,9 -6,8 -6,9
  lines w0.2: -6,8 -5,9 ; -6,-9 6,-9 6,9 -6,9 -6,-9
Mechanical 13:
  lines w0.1: -6,-9 6,-9 6,9 -6,9 -6,-9
Mechanical 15:
  lines w0.1: -0.5,0 0.5,0 ; 0,-0.5 0,0.5 ; -7,-10 7,-10 7,10 -7,10 -7,-10
3D body: height 1.6, standoff 0, extent -6,-9 6,9

## M50-430 Socket 2x10 [mil]
height 240.16
pads (22):
  rect 80x30 smd paste-2 mask+4: 1(0,0) 2(110,0) 3(0,50) 4(110,50) 5(0,100) 6(110,100) 7(0,150) 8(110,150) 9(0,200) 10(110,200) 11(0,250) 12(110,250) 13(0,300) 14(110,300) 15(0,350) 16(110,350) 17(0,400) 18(110,400) 19(0,450) 20(110,450)
  round 5 / inner round 0 / far side round 5 hole 55 paste+0 mask+55: 21(55,-65) 22(54.96,515)
Top Overlay:
  lines w5: -110,-111 215,-111 215,580.51 -110,580.51 -110,-111
  text "1" at -85,-50 h52.5
Mechanical 1:
  lines w2: -35,-100 -35,-50 -10,-50 -10,560.83 115,560.83 115,-100 -35,-100
Mechanical 2:
  lines w0.1: -95.5,-100 210.5,-100 210.5,560.83 -95.5,560.83 -95.5,-100

## M50-490 Socket 2x10 [mm]
height 6.1
pads (20):
  rect 2.95x0.7 smd paste-0.051 mask+0.102: 1(-2.222,-5.715) 2(2.222,-5.715) 3(-2.222,-4.445) 4(2.222,-4.445) 5(-2.222,-3.175) 6(2.222,-3.175) 7(-2.222,-1.905) 8(2.222,-1.905) 9(-2.222,-0.635) 10(2.222,-0.635) 11(-2.222,0.635) 12(2.222,0.635) 13(-2.222,1.905) 14(2.222,1.905) 15(-2.222,3.175) 16(2.222,3.175) 17(-2.222,4.445) 18(2.222,4.445) 19(-2.222,5.715) 20(2.222,5.715)
Top Overlay:
  lines w0.127: -3.95,-7.237 -3.744,-7.444 ; -3.95,7.425 -3.95,-7.45 3.95,-7.45 3.95,7.425 ; -3.95,7.45 3.95,7.45 ; -3.937,-7.087 -3.612,-7.412 ; -3.937,-6.937 -3.437,-7.437 ; -3.937,-6.762 -3.3,-7.4 ; -3.937,-6.612 -3.119,-7.431
Mechanical 1:
  lines w0.051: -2.286,-8.255 -2.286,-6.985 -1.651,-6.985 -1.651,8.53 1.524,8.53 1.524,-8.255 -2.286,-8.255
Mechanical 7:
  lines w0.1: -2.825,-7.325 -2.825,7.325 2.825,7.325 2.825,-7.325 -2.825,-7.325
Mechanical 9:
  lines w0.1: -2.825,-7.325 2.825,-7.325 2.825,7.325 -2.825,7.325 -2.825,-7.325

## MF_2x1_H [mm]
pads (3):
  rect 3x3 hole 1.8 mask+0: 1(0,0)
  round 3 hole 1.8 mask+0: 2(-5.5,0)
  round 3.2 hole 3.2 mask+0: 3(-12.8,0)
Top Overlay:
  lines w0.2: 0.5,-2 0.5,-2.9 -19.4,-2.9 -19.4,2.9 0.5,2.9 0.5,2
Mechanical 7:
  lines w0.2: -19.4,-2.9 0.5,-2.9 0.5,2.9 -19.4,2.9 -19.4,-2.9
Mechanical 10:
  text ".Designator" at -2.67,3.04 h0.8
  text ".Comment" at -2,-3.6 h0.6
3D body "026013101.stp": height 11.4, standoff -3.6, extent -19.435,-2.9 0.5,2.9

## Micro8_A [mm]
height 1.11
pads (8):
  rect 1.3x0.36 smd: 1(-2.115,0.975) 2(-2.115,0.325) 3(-2.115,-0.325) 4(-2.115,-0.975) 5(2.115,-0.975) 6(2.115,-0.325) 7(2.115,0.325) 8(2.115,0.975)
Top Overlay:
  circle w0.2: c-2.075,1.6 r0.1
  lines w0.15: -1.525,-1.525 1.525,-1.525 ; -1.525,1.525 1.525,1.525
Mechanical 7:
  lines w0.1: -1.525,-1.525 -1.525,1.525 ; -0.499,1.525 ccw(c0,1.5) 0.499,1.525 ; 1.525,-1.525 1.525,1.525 ; -2.515,-1.525 2.515,-1.525 2.515,1.525 -2.515,1.525 -2.515,-1.525
Mechanical 10:
  text ".Designator" at -0.67,2.04 h0.8
  text ".Comment" at -0.67,-2.26 h0.6
3D body: height 1.11, standoff 0, extent -1.525,-1.525 1.525,1.525
3D body: height 0.7, standoff 0, extent 1.525,-1.525 2.515,1.525
3D body: height 0.7, standoff 0, extent -2.515,-1.525 -1.525,1.525